# Altium footprint library THT_Bauteile.PcbLib: 59 footprints (part 2 of 4)
Each footprint in its own frame and in the unit in brackets; x right, y up, seen from the top. Pads: shape width x height; smd on the part's side, far side on the other; paste and mask are expansions set on the pad; w line width, h text height; cw(c..) or ccw(c..) is an arc to the next point about the centre after c.
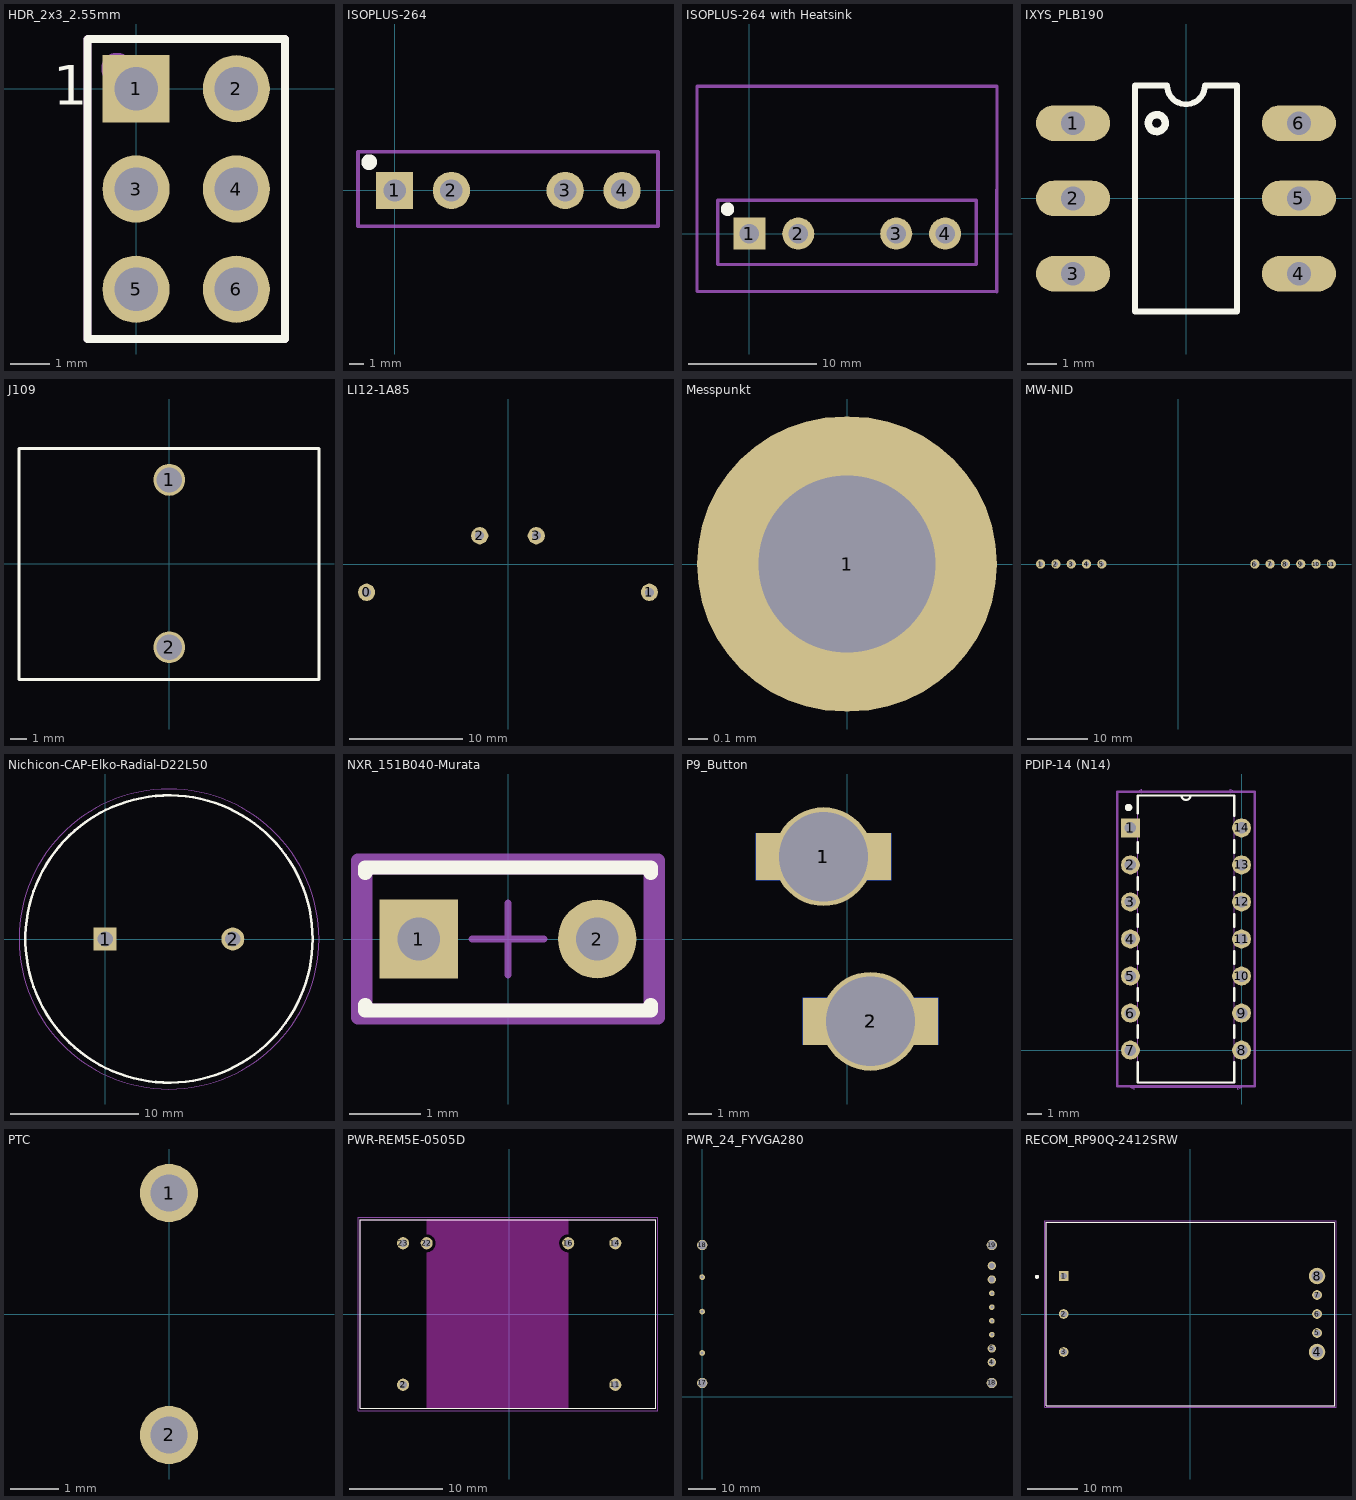
[diagram p1: the footprints below, top view; thin cyan lines are the x and y axes]

## HDR_2x3_2.55mm [mm]
pads (6):
  rect 1.7x1.7 hole 1.1: 1(0,0)
  round 1.7 hole 1.1: 2(2.54,0) 3(0,-2.54) 4(2.54,-2.54) 5(0,-5.08) 6(2.54,-5.08)
Top Overlay:
  lines w0.2: 0.65,1.26 3.77,1.26 3.77,-6.34 -1.23,-6.34 -1.23,1.245 -1.215,1.26 1.92,1.26
  text "1" at -2.1,-0.4 h1
Top 3D Body:
  circle w0.6: c-0.48,0.51 r0.1
  lines w0.2: -1.23,-6.34 -1.23,1.26 3.77,1.26 3.77,-6.34 -1.23,-6.34
  text ".Designator" at 2.008,-4.636 h1.52
3D body "961206-6404-XX-header3x2.stp": height 8.01, standoff -3.29, extent -1.23,-6.35 3.77,1.27

## ISOPLUS-264 [mm] "ISOPLUS-264, 4-Pin, THT"
height 30
pads (4):
  rect 2.5x2.5 hole 1.5: 1(0,0)
  round 2.5 hole 1.5: 2(3.81,0) 3(11.43,0) 4(15.24,0)
Top Overlay:
  circle w0.6: c-1.7,1.9 r0.224
Mechanical 15:
  lines w0.1: -2.45,-2.4 17.65,-2.4 17.65,2.6 -2.45,2.6 -2.45,-2.4
  lines w0.254: -2.45,-2.4 -2.45,2.6 17.65,2.6 17.65,-2.4 -2.45,-2.4
3D body: height 29, standoff 3, extent -2.5,-2.5 17.6,2.6

## ISOPLUS-264 with Heatsink [mm] "ISOPLUS-264, 4-Pin, THT"
height 30
pads (4):
  rect 2.5x2.5 hole 1.5: 1(0,0)
  round 2.5 hole 1.5: 2(3.81,0) 3(11.43,0) 4(15.24,0)
Top Overlay:
  circle w0.6: c-1.7,1.9 r0.224
Mechanical 15:
  lines w0.1: -2.45,-2.4 -2.45,2.6 17.65,2.6 17.65,-2.4 -2.45,-2.4
  lines w0.254: -4.075,-4.475 -4.075,11.475 19.275,11.475 19.25,-4.525 -4.075,-4.475 ; -2.45,-2.4 17.65,-2.4 17.65,2.6 -2.45,2.6 -2.45,-2.4
3D body "ohmite_WA-T264-101E.stp": height 34.76, standoff -0.8, extent -4.084,-4.525 19.284,11.477
3D body: height 29, standoff 3, extent -2.5,-2.5 17.6,2.6

## IXYS_PLB190 [mm]
pads (6):
  oval 2.5x1.2 hole 0.8: 1(-3.81,2.54) 2(-3.81,0) 3(-3.81,-2.54) 4(3.81,-2.54) 5(3.81,0) 6(3.81,2.54)
Top Overlay:
  circle w0.254: c-0.986,2.54 r0.284
  lines w0.2: -1.725,-3.81 -1.725,3.81 -0.635,3.81 ccw(c0,3.81) 0.635,3.81 1.725,3.81 1.725,-3.81 -1.725,-3.81
3D body: height 3.3, standoff 0.76, extent -3.397,-4.445 3.397,4.445

## J109 [mm]
pads (2):
  round 1.9 hole 1.5: 1(0,5) 2(0,-5)
Top Overlay:
  lines w0.2: -8.975,-6.925 -8.975,5.292 -8.975,6.875 -8.823,6.875 -7.51,6.875 8.95,6.875 8.95,-6.925 -8.975,-6.925
3D body: height 23, standoff 0, extent -8.763,-6.75 8.75,6.75

## LI12-1A85 [mm]
pads (4):
  round 1.524 hole 0.8: 0(-12.5,-2.5) 1(12.5,-2.5) 2(-2.5,2.5) 3(2.5,2.5)
3D body: height 0, standoff -3.3, extent 12.175,-2.825 12.825,-2.175
3D body: height 0, standoff -3.3, extent 2.175,2.175 2.825,2.825
3D body: height 0, standoff -3.3, extent -2.825,2.175 -2.175,2.825
3D body: height 0, standoff -3.3, extent -12.825,-2.825 -12.175,-2.175
3D body: height 10.4, standoff 0, extent -15,-5 15,5

## Messpunkt [mm]
pads (1):
  oval 1.524x1.5 hole 0.9: 1(0,0)

## MW-NID [mil] "MeanWell NID Series"
height 1062.99
pads (11):
  round 60 hole 30: 1(-900,0) 2(-800,0) 3(-700,0) 4(-600,0) 5(-500,0) 6(500,0) 7(600,0) 8(700,0) 9(800,0) 10(900,0) 11(1000,0)
3D body: height 1023.62, standoff 39.37, extent -950,-25 1050,410

## Nichicon-CAP-Elko-Radial-D22L50 [mm]
height 52
pads (2):
  rect 1.8x1.8 hole 1.2: 1(0,0)
  round 1.8 hole 1.2: 2(10,0)
Top Overlay:
  circle w0.2: c5,0 r11.25
Mechanical 13:
  circle w0.1: c5,0 r11.25
Mechanical 15:
  circle w0.05: c5,0 r11.75
3D body "UVZ1V103MRD.stp": height 52, standoff -10, extent -6.5,-11.5 16.5,11.5

## NXR_151B040-Murata [mm]
pads (2):
  rect 1.1x1.1 hole 0.6 paste-2539.97 mask+0: 1(-1.25,0)
  round 1.1 hole 0.6 paste-2539.97 mask+0: 2(1.25,0)
Top Overlay:
  lines w0.2: -2,-0.925 -2,-1 2,-1 2,-0.925 ; -2,0.925 -2,1 2,1 2,0.925
Top 3D Body:
  lines w0.2: -2,-1 2,-1 2,1 -2,1 -2,-1
Top Assembly:
  lines w0.2: -2.1,-1.1 2.1,-1.1 2.1,1.1 -2.1,1.1 -2.1,-1.1
Top Courtyard:
  lines w0.2: -2.1,-1.1 -2.1,1.1 2.1,1.1 2.1,-1.1 -2.1,-1.1
Top Component Center:
  lines w0.1: -0.5,0 0.5,0 ; 0,-0.5 0,0.5
3D body "Res_Murata_NXRS15XV502FA1B040_simplify.stp": height 37, standoff -4, extent -2,-1.002 2,1

## P9_Button [mm]
pads (6):
  round 4.2 hole 3.8: 1(-1,3.5) 2(1,-3.5)
  rect 5.75x2 smd: 1(-1,3.5) 2(1,-3.5)
  rect 5.75x2 smd far side: 1(-1,3.5) 2(1,-3.5)

## PDIP-14 (N14) [mil]
height 0.2
pads (14):
  rect 51x51 hole 31: 1(-300,600)
  round 51 hole 31: 2(-300,500) 3(-300,400) 4(-300,300) 5(-300,200) 6(-300,100) 7(-300,0) 8(0,0) 9(0,100) 10(0,200) 11(0,300) 12(0,400) 13(0,500) 14(0,600)
Top Overlay:
  circle w10: c-305,655 r5
  lines w6: -280,-33.01 -280,-87.5 -20,-87.5 -20,-33.01 ; -280,33.01 -280,66.99 ; -280,133.01 -280,166.99 ; -280,233.01 -280,266.99 ; -280,333.01 -280,366.99 ; -280,433.01 -280,466.99 ; -280,533.01 -280,561.4 ; -280,638.6 -280,687.5 -20,687.5 -20,633.01 ; -162,687.5 ccw(c-150,687.5) -138,687.5 ; -20,33.01 -20,66.99 ; -20,133.01 -20,166.99 ; -20,233.01 -20,266.99 ; -20,333.01 -20,366.99 ; -20,433.01 -20,466.99 ; -20,533.01 -20,566.99
Mechanical 7:
  lines w1: -300,-100 -290,-105 -290,-95 -300,-100 ; -300,-100 0,-100 ; -280,700 -270,695 -270,705 -280,700 ; -280,700 -20,700 ; -20,700 -30,695 -30,705 -20,700 ; 0,-100 -10,-105 -10,-95 0,-100
Mechanical 13:
  lines w0: -162,687.5 ccw(c-150,687.5) -138,687.5
  lines w1: -315.5,-15.5 -280,-15.5 -280,15.5 -315.5,15.5 -315.5,-15.5 ; -315.5,84.5 -280,84.5 -280,115.5 -315.5,115.5 -315.5,84.5 ; -315.5,184.5 -280,184.5 -280,215.5 -315.5,215.5 -315.5,184.5 ; -315.5,284.5 -280,284.5 -280,315.5 -315.5,315.5 -315.5,284.5 ; -315.5,384.5 -280,384.5 -280,415.5 -315.5,415.5 -315.5,384.5 ; -315.5,484.5 -280,484.5 -280,515.5 -315.5,515.5 -315.5,484.5 ; -315.5,584.5 -280,584.5 -280,615.5 -315.5,615.5 -315.5,584.5 ; -280,-87.5 -280,687.5 -20,687.5 -20,-87.5 -280,-87.5 ; -20,-15.5 15.5,-15.5 15.5,15.5 -20,15.5 -20,-15.5 ; -20,84.5 15.5,84.5 15.5,115.5 -20,115.5 -20,84.5 ; -20,184.5 15.5,184.5 15.5,215.5 -20,215.5 -20,184.5 ; -20,284.5 15.5,284.5 15.5,315.5 -20,315.5 -20,284.5 ; -20,384.5 15.5,384.5 15.5,415.5 -20,415.5 -20,384.5 ; -20,484.5 15.5,484.5 15.5,515.5 -20,515.5 -20,484.5 ; -20,584.5 15.5,584.5 15.5,615.5 -20,615.5 -20,584.5
Mechanical 15:
  lines w6: -335.5,-97.5 -335.5,697.5 35.5,697.5 35.5,-97.5 -335.5,-97.5
3D body: height 10, standoff 0, extent 0,0 10,10
3D body "N14.step": height 205.12, standoff -100, extent -305,-87.48 15,687.48

## PTC [mm]
pads (2):
  round 1.2 hole 0.762: 1(0,2.5) 2(0,-2.5)

## PWR-REM5E-0505D [mm] "Recom Power"
height 10.2
pads (6):
  round 1.308 hole 0.8: 2(-11.43,-7.62) 11(11.43,-7.62) 14(11.43,7.62) 16(6.35,7.62) 22(-8.89,7.62) 23(-11.43,7.62)
Top Overlay:
  lines w0.127: -16.03,-10.15 -16.03,10.15 15.77,10.15 15.77,-10.15 -16.03,-10.15
Keep-Out Layer:
  drawing of 9 lines, arcs and shapes, not listed
Mechanical 4:
  lines w0.127: -16.03,-10.15 -16.03,10.15 ; -16.03,-10.15 15.77,-10.15 ; -16.03,-10.15 -16.03,10.15 ; -16.03,-10.15 15.77,-10.15 ; -16.03,10.15 15.77,10.15 ; -16.03,10.15 15.77,10.15 ; 15.77,-10.15 15.77,10.15 ; 15.77,-10.15 15.77,10.15
Mechanical 16:
  lines w0.05: -16.28,-10.4 -16.28,10.4 16.02,10.4 16.02,-10.4 -16.28,-10.4
3D body "REM5E_A.step": height 10.2, standoff -4, extent -15.9,-10.15 15.9,10.15

## PWR_24_FYVGA280 [mm] "800W DCDC"
pads (15):
  round 2.1 hole 1.1: 1(0,44.04) 2(0,31.34) 3(0,16.1) 6(106.68,22.83) 7(106.68,27.91) 8(106.68,32.99) 9(106.68,38.07)
  round 3.1 hole 2.1: 4(106.68,12.67) 5(106.68,17.75) 10(106.68,43.15) 11(106.68,48.23)
  round 3.8 hole 3.2: 17(0,5.05) 18(0,55.85) 18(106.68,5.05) 19(106.68,55.85)
3D body: height 12.9, standoff 0, extent -4.8,0 111.4,60.9
3D body "03_DCDC_Heatsink_side_prt_efr16.stp": height 32.9, standoff 12.75, extent -28.04,0 134.65,61

## RECOM_RP90Q-2412SRW [mm]
pads (8):
  rect 1.95x1.95 hole 1.3: 1(-25.4,7.62)
  round 1.95 hole 1.3: 2(-25.4,0) 3(-25.4,-7.62) 5(25.4,-3.81) 6(25.4,0) 7(25.4,3.81)
  round 3.316 hole 2.3: 4(25.4,-7.62) 8(25.4,7.62)
Top Overlay:
  circle w0.4: c-30.76,7.46 r0.2
  lines w0.127: -28.95,-18.4 -28.95,18.4 28.95,18.4 28.95,-18.4 -28.95,-18.4
Mechanical 4:
  circle w0.4: c-30.76,7.46 r0.2
  circle w0.4: c-30.76,7.46 r0.2
  lines w0.127: -28.95,-18.4 -28.95,18.4 ; -28.95,-18.4 28.95,-18.4 ; -28.95,-18.4 -28.95,18.4 ; -28.95,-18.4 28.95,-18.4 ; -28.95,18.4 28.95,18.4 ; -28.95,18.4 28.95,18.4 ; 28.95,-18.4 28.95,18.4 ; 28.95,-18.4 28.95,18.4
Mechanical 16:
  lines w0.05: -29.2,-18.65 -29.2,18.65 29.2,18.65 29.2,-18.65 -29.2,-18.65
3D body "RP90Q-RW.step": height 12.8, standoff -4.58, extent -28.955,-18.415 28.955,18.415